# Altium footprint library USLI_Schematics.PcbLib: 92 footprints (part 4 of 6)
Each footprint in its own frame and in the unit in brackets; x right, y up, seen from the top. Pads: shape width x height; smd on the part's side, far side on the other; paste and mask are expansions set on the pad; w line width, h text height; cw(c..) or ccw(c..) is an arc to the next point about the centre after c.
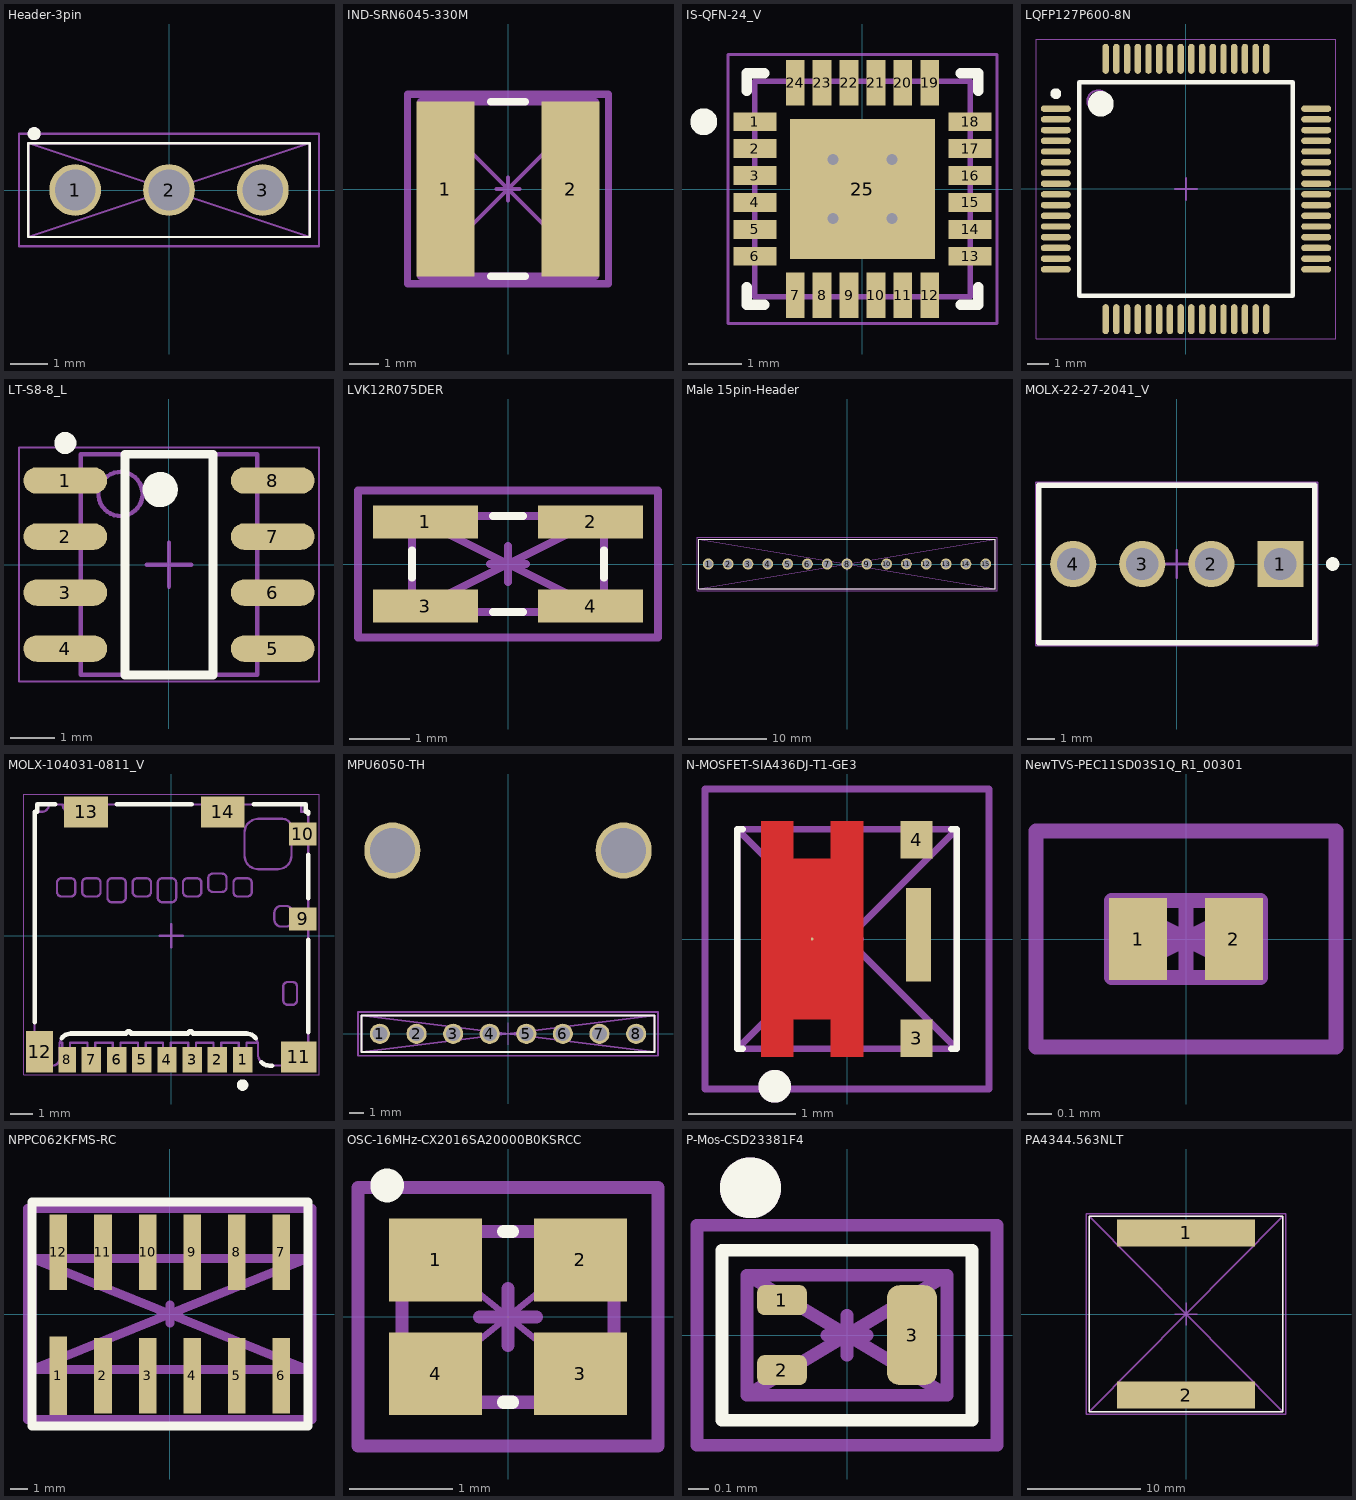
[diagram p3: the footprints below, top view; thin cyan lines are the x and y axes]

## Header-3pin [mm]
pads (3):
  round 1.4 hole 1.1 mask+0.05: 1(-2.54,0) 2(0,0) 3(2.54,0)
Top Overlay:
  circle w0.254: c-3.65,1.525 r0.05
  lines w0.064: -3.81,-1.27 -3.81,1.27 3.81,1.27 3.81,-1.27 -3.81,-1.27
Mechanical 1:
  lines w0.064: -3.81,-1.27 3.81,1.27 ; -3.81,-1.27 3.81,-1.27 ; -3.81,-1.27 -3.81,1.27 ; -3.81,1.27 3.81,-1.27 ; -3.81,1.27 3.81,1.27 ; 3.81,-1.27 3.81,1.27
  lines w0.254: -3.608,1.553 ccw(c-3.65,1.525) -3.601,1.533
Top Courtyard:
  lines w0.064: -4.06,-1.52 -3.825,-1.52 3.825,-1.52 4.06,-1.52 4.06,1.52 3.85,1.52 -3.825,1.52 -4.06,1.52 -4.06,-1.52
Top Component Center:
  lines w0.064: -0.225,0 0.225,0 ; 0,-0.175 0,0.175
3D body "61300311121.stp": height 8.55, standoff -2.99, extent -3.81,-1.27 3.81,1.27

## IND-SRN6045-330M [mm]
pads (2):
  rect 2x6 smd mask+0.05: 1(-2.15,0) 2(2.15,0)
Top Overlay:
  lines w0.256: -0.6,-3 0.6,-3 ; -0.6,3 0.6,3
Mechanical 1:
  lines w0.128: -3,-3 3,3 ; -3,3 3,-3
  lines w0.256: -3,-3 3,-3 3,3 -3,3 -3,-3
Top Courtyard:
  lines w0.256: -3.45,-3.25 3.45,-3.25 3.45,3.25 -3.45,3.25 -3.45,-3.25
Top Component Center:
  lines w0.128: -0.4,0 0.4,0 ; 0,-0.4 0,0.4
3D body "srn6045-330m.stp": height 4.5, standoff 0, extent -3,-3 3,3

## IS-QFN-24_V [mm] "QFN, 24-Leads, Body 4x4mm, Pitch 0.5mm, Thermal Pad 2.7x2.6mm"
height 0.95
pads (25):
  rect 0.8x0.35 smd mask+0.05: 1(-2,1.25) 2(-2,0.75) 3(-2,0.25) 4(-2,-0.25) 5(-2,-0.75) 6(-2,-1.25) 13(2,-1.25) 14(2,-0.75) 15(2,-0.25) 16(2,0.25) 17(2,0.75) 18(2,1.25)
  rect 0.35x0.85 smd mask+0.05: 7(-1.25,-1.975) 8(-0.75,-1.975) 9(-0.25,-1.975) 10(0.25,-1.975) 11(0.75,-1.975) 12(1.25,-1.975) 19(1.25,1.975) 20(0.75,1.975) 21(0.25,1.975) 22(-0.25,1.975) 23(-0.75,1.975) 24(-1.25,1.975)
  rect 2.7x2.6 smd mask+0.05: 25(0,0)
via -0.55,-0.55 diameter 0.5 hole 0.2
via 0.55,-0.55 diameter 0.5 hole 0.2
via 0.55,0.55 diameter 0.5 hole 0.2
via -0.55,0.55 diameter 0.5 hole 0.2
Top Overlay:
  circle w0.25: c-2.95,1.25 r0.125
  lines w0.2: -2.15,-1.825 -2.15,-2.15 -1.825,-2.15 ; -2.15,1.825 -2.15,2.15 -1.825,2.15 ; 1.825,-2.15 2.15,-2.15 2.15,-1.825 ; 1.825,2.15 2.15,2.15 2.15,1.825
Mechanical 13:
  lines w0.1: -2,-2 -2,2 2,2 2,-2 -2,-2
Mechanical 15:
  lines w0.05: -2.5,-2.5 2.5,-2.5 2.5,2.5 -2.5,2.5 -2.5,-2.5
  lines w0.1: -0.5,0 0.5,0 ; 0,-0.5 0,0.5
3D body: height 0.95, standoff 0, extent -1.999,-1.999 1.999,1.999

## LQFP127P600-8N [mm] "ARM® Cortex®-M3 STM32F1 Microcontroller IC 32-Bit Single-Core 72MHz 128KB (128K x 8) FLASH"
height 1.6
pads (64):
  oval 1.4x0.3 smd mask+0.05: 1(-6.075,3.75) 2(-6.075,3.25) 3(-6.075,2.75) 4(-6.075,2.25) 5(-6.075,1.75) 6(-6.075,1.25) 7(-6.075,0.75) 8(-6.075,0.25) 9(-6.075,-0.25) 10(-6.075,-0.75) 11(-6.075,-1.25) 12(-6.075,-1.75) 13(-6.075,-2.25) 14(-6.075,-2.75) 15(-6.075,-3.25) 16(-6.075,-3.75) 33(6.075,-3.75) 34(6.075,-3.25) 35(6.075,-2.75) 36(6.075,-2.25) 37(6.075,-1.75) 38(6.075,-1.25) 39(6.075,-0.75) 40(6.075,-0.25) 41(6.075,0.25) 42(6.075,0.75) 43(6.075,1.25) 44(6.075,1.75) 45(6.075,2.25) 46(6.075,2.75) 47(6.075,3.25) 48(6.075,3.75)
  oval 0.3x1.4 smd mask+0.05: 17(-3.75,-6.075) 18(-3.25,-6.075) 19(-2.75,-6.075) 20(-2.25,-6.075) 21(-1.75,-6.075) 22(-1.25,-6.075) 23(-0.75,-6.075) 24(-0.25,-6.075) 25(0.25,-6.075) 26(0.75,-6.075) 27(1.25,-6.075) 28(1.75,-6.075) 29(2.25,-6.075) 30(2.75,-6.075) 31(3.25,-6.075) 32(3.75,-6.075) 49(3.75,6.075) 50(3.25,6.075) 51(2.75,6.075) 52(2.25,6.075) 53(1.75,6.075) 54(1.25,6.075) 55(0.75,6.075) 56(0.25,6.075) 57(-0.25,6.075) 58(-0.75,6.075) 59(-1.25,6.075) 60(-1.75,6.075) 61(-2.25,6.075) 62(-2.75,6.075) 63(-3.25,6.075) 64(-3.75,6.075)
Top Overlay:
  circle w0.6: c-3.975,3.975 r0.3
  circle w0.25: c-6.075,4.45 r0.125
  lines w0.2: -4.975,-4.975 4.975,-4.975 4.975,4.975 -4.975,4.975 -4.975,-4.975
Top Courtyard:
  lines w0.05: -7,-7 7,-7 7,7 -7,7 -7,-7
  lines w0.1: -0.5,0 0.5,0 ; 0,-0.5 0,0.5
Top Assembly:
  circle w0.1: c-4.1,4.1 r0.5
  lines w0.1: -5,-5 5,-5 5,5 -5,5 -5,-5
3D body "STM32F103RBT6.step": height 1.53, standoff -0.07, extent -6,-6 6,6

## LT-S8-8_L [mm] "SOIC, 8-Leads, Body 5x4mm, Pitch 1.27mm, IPC High Density"
height 1.76
pads (8):
  oval 1.9x0.6 smd: 1(-2.35,1.905) 2(-2.35,0.635) 3(-2.35,-0.635) 4(-2.35,-1.905) 5(2.35,-1.905) 6(2.35,-0.635) 7(2.35,0.635) 8(2.35,1.905)
Top Overlay:
  circle w0.25: c-2.35,2.755 r0.125
  circle w0.4: c-0.2,1.7 r0.2
  lines w0.2: -1,-2.5 -1,2.5 1,2.5 1,-2.5 -1,-2.5
Mechanical 13:
  circle w0.1: c-1.1,1.6 r0.5
  lines w0.1: -2,-2.5 -2,2.5 2,2.5 2,-2.5 -2,-2.5
Mechanical 15:
  lines w0.05: -3.4,-2.65 -3.4,2.65 3.4,2.65 3.4,-2.65 -3.4,-2.65
  lines w0.1: -0.5,0 0.5,0 ; 0,-0.5 0,0.5
3D body: height 1.76, standoff 0.1, extent -2,-2.5 2,2.5

## LVK12R075DER [mm]
pads (4):
  rect 1.75x0.55 smd mask+0.05: 1(-1.375,0.7) 2(1.375,0.7) 3(-1.375,-0.7) 4(1.375,-0.7)
Top Overlay:
  lines w0.127: -1.6,-0.23 -1.6,0.23 ; -0.25,-0.8 0.25,-0.8 ; -0.25,0.8 0.25,0.8 ; 1.6,-0.23 1.6,0.23
Mechanical 1:
  lines w0.127: -1.6,-0.8 1.6,-0.8 ; -1.6,-0.8 -1.6,0.8 ; -1.6,-0.8 1.6,0.8 ; -1.6,0.8 1.6,0.8 ; -1.6,0.8 1.6,-0.8 ; 1.6,-0.8 1.6,0.8
Top Courtyard:
  lines w0.127: -2.5,-1.225 -2.5,1.225 2.5,1.225 2.5,-1.225 -2.5,-1.225
Top Component Center:
  lines w0.127: -0.3,0 0.3,0 ; 0,-0.3 0,0.3
3D body "LVK12R075DER.stp": height 0.75, standoff 0, extent -2.14,-1.14 2.14,1.14

## Male 15pin-Header [mm]
pads (15):
  round 1.4 hole 1.02 mask+0.05: 1(-17.78,0) 2(-15.24,0) 3(-12.7,0) 4(-10.16,0) 5(-7.62,0) 6(-5.08,0) 7(-2.54,0) 8(0,0) 9(2.54,0) 10(5.08,0) 11(7.62,0) 12(10.16,0) 13(12.7,0) 14(15.24,0) 15(17.78,0)
Top Overlay:
  lines w0.064: -18.975,-3.175 -18.975,3.175 18.975,3.175 18.975,-3.175 -18.975,-3.175
Mechanical 1:
  lines w0.064: -18.975,-3.175 18.975,3.175 ; -18.975,-3.175 -18.975,3.175 ; -18.975,-3.175 18.975,-3.175 ; -18.975,3.175 18.975,-3.175 ; -18.975,3.175 18.975,3.175 ; 18.975,-3.175 18.975,3.175
Top Courtyard:
  lines w0.064: -19.225,-3.425 -19.225,3.425 19.225,3.425 19.225,-3.425 -19.225,-3.425
Top Component Center:
  lines w0.064: -0.775,0 0,0 0.775,0 ; 0,-0.775 0,0.775
3D body "022232151.stp": height 10.58, standoff -3.64, extent -18.974,-3.251 18.974,3.099

## MOLX-22-27-2041_V [mm] "CONN, 4-Leads, Body 10.16x5.8mm, Pitch 2.54mm"
height 11.7
pads (4):
  rect 1.7x1.7 hole 1.19: 1(3.81,0)
  round 1.7 hole 1.19: 2(1.27,0) 3(-1.27,0) 4(-3.81,0)
Top Overlay:
  circle w0.25: c5.73,0 r0.125
  lines w0.2: -5.08,-2.9 5.08,-2.9 5.08,2.9 -5.08,2.9 -5.08,-2.9
Mechanical 13:
  lines w0.1: -5.08,-2.9 5.08,-2.9 5.08,2.9 -5.08,2.9 -5.08,-2.9
Mechanical 15:
  lines w0.05: -5.18,-3 -5.18,3 5.18,3 5.18,-3 -5.18,-3
  lines w0.1: -0.5,0 0.5,0 ; 0,-0.5 0,0.5
3D body "022272041.stp": height 11.7, standoff -3.56, extent -5.08,-2.9 5.08,2.9

## MOLX-104031-0811_V [mm] "Micro SD, 8-Leads, Body 11.95x11.4mm, Pitch 1.1mm"
height 1.57
pads (14):
  rect 0.85x1.1 smd: 1(3.113,-5.412) 2(2.013,-5.412) 3(0.913,-5.412) 4(-0.188,-5.412) 5(-1.288,-5.412) 6(-2.387,-5.412) 7(-3.487,-5.412)
  rect 0.75x1.1 smd: 8(-4.537,-5.412)
  rect 1.2x1 smd: 9(5.748,0.738) 10(5.748,4.438)
  rect 1.55x1.35 smd: 11(5.573,-5.287)
  rect 1.17x1.8 smd: 12(-5.747,-5.062)
  rect 1.9x1.35 smd: 13(-3.722,5.413) 14(2.248,5.413)
Top Overlay:
  circle w0.25: c3.113,-6.512 r0.125
  lines w0.2: -5.968,-3.762 -5.968,5.418 -5.848,5.418 -5.848,5.738 -5.343,5.738 -5.072,5.738 ; -4.777,-4.462 cw(c-4.378,-4.762) -4.378,-4.262 -1.962,-4.262 cw(c-1.862,-4.262) -1.862,-4.162 cw(c-1.862,-4.262) -1.762,-4.262 0.738,-4.262 cw(c0.838,-4.262) 0.838,-4.162 cw(c0.838,-4.262) 0.938,-4.262 3.283,-4.262 cw(c3.283,-4.762) 3.692,-4.476 ; -2.372,5.738 0.898,5.738 ; 3.598,5.738 5.678,5.738 5.863,5.738 5.863,5.418 5.983,5.418 5.983,5.338 ; 3.938,-5.525 ccw(c4.283,-5.162) 4.283,-5.662 4.397,-5.662 ; 5.977,-4.212 5.977,-0.162 ; 5.983,1.638 5.983,3.538
Mechanical 13:
  drawing of 227 lines, arcs and shapes, not listed
Mechanical 15:
  lines w0.05: -6.432,-6.062 -6.432,6.188 6.448,6.188 6.448,-6.062 -6.432,-6.062
  lines w0.1: -0.5,0 0.5,0 ; 0,-0.5 0,0.5
3D body "1040310811.stp": height 1.45, standoff 0, extent -5.967,-5.662 5.983,5.738

## MPU6050-TH [mm] "HDR100IMP08F-G-V-ST"
pads (10):
  round 1.4 hole 1.02 mask+0.05: 1(-8.89,0) 2(-6.35,0) 3(-3.81,0) 4(-1.27,0) 5(1.27,0) 6(3.81,0) 7(6.35,0) 8(8.89,0)
  round 3.9 hole 3.12 mask+0.05: ""(-8.025,12.725) ""(8.025,12.725)
Top Overlay:
  lines w0.127: -10.16,-1.27 10.16,-1.27 10.16,1.27 -10.16,1.27 -10.16,-1.27
Mechanical 1:
  lines w0.127: -10.16,-1.27 10.16,1.27 ; -10.16,-1.27 10.16,-1.27 ; -10.16,-1.27 -10.16,1.27 ; -10.16,1.27 10.16,-1.27 ; -10.16,1.27 10.16,1.27 ; 10.16,-1.27 10.16,1.27
Top Courtyard:
  lines w0.127: -10.41,-1.52 -10.41,1.52 10.41,1.52 10.41,-1.52 -10.41,-1.52
Top Component Center:
  lines w0.064: -0.775,0 0,0 0.775,0 ; 0,-0.775 0,0.775
3D body "CHC M3 L12.step": height 13.3, standoff -1.7, extent 5.3,10 10.75,15.45
3D body "CHC M3 L12.step": height 13.3, standoff -1.7, extent -10.75,10 -5.3,15.45
3D body "MPU_6050.step": height 11.5, standoff 8.5, extent -10.25,-1 10.25,15
3D body "pin_header_female_2.54mm_0.1in.STEP": height 8.5, standoff -8.26, extent -10.16,-1.27 10.16,1.27

## N-MOSFET-SIA436DJ-T1-GE3 [mm]
pads (4):
  rect 0.3x0.35 smd mask+0.05: 3(0.65,-0.925) 4(0.65,0.925)
  round 0.025 smd mask+0.05: 5(-0.325,0)
  rect 0.235x0.87 smd mask+0.05: ""(0.667,0.04)
Top Layer:
  region: -0.501,-0.756 -0.5,-0.755 -0.501,-0.928 -0.502,-1.099 -0.799,-1.099 -0.8,-1.099 -0.8,1.1 -0.5,1.1 -0.5,0.75 -0.15,0.75 -0.15,1.1 0.15,1.1 0.15,-1.1 -0.149,-1.1 -0.15,-1.1 -0.15,-0.926 -0.15,-0.751 -0.452,-0.751 -0.5,-0.751 -0.5,-0.756
Top Overlay:
  circle w0.254: c-0.675,-1.375 r0.025
  lines w0.064: -0.975,-1.025 -1.025,-1.025 -1.025,1.025 -0.975,1.025 ; 0.975,-1.025 1.025,-1.025 1.025,1.025 0.975,1.025
Mechanical 1:
  circle w0.254: c-0.675,-1.375 r0.025
  lines w0.064: -1.025,-1.025 -1.025,1.025 ; -1.025,-1.025 1.025,-1.025 ; -1.025,-1.025 1.025,1.025 ; -1.025,1.025 1.025,1.025 ; -1.025,1.025 1.025,-1.025 ; 1.025,-1.025 1.025,1.025
Top Courtyard:
  lines w0.064: -1.325,-1.4 -1.325,1.4 -1.075,1.4 1.05,1.4 1.325,1.4 1.325,-1.4 1.05,-1.4 -1.025,-1.4 -1.325,-1.4
Top Component Center:
  lines w0.064: -0.125,0 0,0 0.125,0 ; 0,-0.125 0,0.125
3D body "SIA436DJ-T1-GE3.STEP": height 0.8, standoff 0, extent -1.025,-1.025 1.025,1.025

## NewTVS-PEC11SD03S1Q_R1_00301 [mm]
pads (2):
  rect 0.24x0.34 smd mask+0.05: 1(-0.2,0) 2(0.2,0)
Mechanical 1:
  lines w0.064: -0.31,-0.16 0.31,0.16 ; -0.31,-0.16 -0.31,0.16 ; -0.31,-0.16 -0.31,0.16 ; -0.31,-0.16 0.31,-0.16 ; -0.31,0.16 0.31,-0.16 ; -0.31,0.16 0.31,0.16 ; 0.31,-0.16 0.31,0.16
Top Courtyard:
  lines w0.064: -0.625,-0.45 -0.625,0.45 0.625,0.45 0.625,-0.45 -0.625,-0.45
Top Component Center:
  lines w0.064: -0.15,0 0,0 0.15,0 ; 0,-0.15 0,0.15
3D body "0201_RES.stp": height 0.2, standoff -0.02, extent -0.3,-0.15 0.3,0.15

## NPPC062KFMS-RC [mm]
pads (12):
  rect 1x4.5 smd mask+0.05: 1(-6.35,-3.52)
  rect 1x4.32 smd mask+0.05: 2(-3.81,-3.52) 3(-1.27,-3.52) 4(1.27,-3.52) 5(3.81,-3.52) 6(6.35,-3.52) 7(6.35,3.52) 8(3.81,3.52) 9(1.27,3.52) 10(-1.27,3.52) 11(-3.81,3.52) 12(-6.35,3.52)
Top Overlay:
  lines w0.512: -7.87,-6.4 -7.87,6.4 7.87,6.4 7.87,-6.4 -7.87,-6.4
Mechanical 1:
  lines w0.512: -7.87,-3.175 -7.87,3.175 ; -7.87,-3.175 7.87,-3.175 ; -7.87,-3.175 7.87,3.175 ; -7.87,3.175 7.87,3.175 ; -7.87,3.175 7.87,-3.175 ; 7.87,-3.175 7.87,3.175
Top Courtyard:
  lines w0.512: -8.12,-6.025 8.12,-6.025 8.12,6.025 -8.12,6.025 -8.12,-6.025
Top Component Center:
  lines w0.512: -0.5,0 0,0 0.5,0 ; 0,-0.5 0,0.5
3D body "NPPC062KFMS-RC.STEP": height 7.59, standoff 0.1, extent -7.874,-3.429 7.874,3.429

## OSC-16MHz-CX2016SA20000B0KSRCC [mm]
pads (4):
  rect 0.9x0.8 smd mask+0.05: 1(-0.7,0.55) 2(0.7,0.55) 3(0.7,-0.55) 4(-0.7,-0.55)
Top Overlay:
  circle w0.254: c-1.168,1.27 r0.035
  lines w0.127: -0.045,-0.825 0.045,-0.825 ; -0.045,0.825 0.045,0.825
Mechanical 1:
  circle w0.254: c-1.168,1.27 r0.025
  lines w0.064: -1.025,-0.825 1.025,0.825 ; -1.025,0.825 1.025,-0.825
  lines w0.127: -1.025,-0.825 1.025,-0.825 1.025,0.825 -1.025,0.825 -1.025,-0.825
Top Courtyard:
  lines w0.127: -1.175,-1.25 -1.45,-1.25 -1.45,1.25 -1.125,1.25 1.175,1.25 1.45,1.25 ; -1.175,-1.25 1.175,-1.25 ; -1.175,-1.25 1.175,-1.25 ; 1.175,-1.25 1.45,-1.25 ; 1.45,-1.25 1.45,1.25 ; 1.45,-1.25 1.45,1.25
Top Component Center:
  lines w0.127: -0.275,0 0.275,0 ; 0,-0.275 0,0.275

## P-Mos-CSD23381F4 [mm]
pads (3):
  rrect50% 0.25x0.15 smd mask+0.05: 1(-0.325,0.175) 2(-0.325,-0.175)
  rrect50% 0.25x0.5 smd mask+0.05: 3(0.325,0)
Top Overlay:
  circle w0.254: c-0.483,0.737 r0.025
  lines w0.064: -0.625,-0.425 -0.625,0.425 0.625,0.425 0.625,-0.425 -0.625,-0.425
Mechanical 1:
  circle w0.254: c-0.483,0.737 r0.025
  lines w0.064: -0.5,-0.3 0.5,-0.3 ; -0.5,-0.3 -0.5,0.3 ; -0.5,-0.3 -0.5,0.3 ; -0.5,-0.3 0.5,0.3 ; -0.5,0.3 0.5,0.3 ; -0.5,0.3 0.5,-0.3 ; 0.5,-0.3 0.5,0.3
Top Courtyard:
  lines w0.064: -0.75,-0.55 0.75,-0.55 0.75,0.55 -0.75,0.55 -0.75,-0.55
Top Component Center:
  lines w0.064: -0.1,0 0,0 0.1,0 ; 0,-0.1 0,0.1
3D body "YJC0003A_TEX.step": height 0.34, standoff 0, extent -0.521,-0.318 0.521,0.318

## PA4344.563NLT [mm]
pads (2):
  rect 12.2x2.4 smd mask+0.05: 1(0,7.2) 2(0,-7.2)
Top Overlay:
  lines w0.127: -8.6,-8.65 -8.6,8.65 8.6,8.65 8.6,-8.65 -8.6,-8.65
Mechanical 1:
  lines w0.127: -8.6,-8.65 8.6,8.65 ; -8.6,-8.65 -8.6,8.65 ; -8.6,-8.65 8.6,-8.65 ; -8.6,8.65 8.6,-8.65 ; -8.6,8.65 8.6,8.65 ; 8.6,-8.65 8.6,8.65
Top Courtyard:
  lines w0.127: -8.85,-8.9 -8.85,8.9 8.85,8.9 8.85,-8.9 -8.85,-8.9
Top Component Center:
  lines w0.127: -1,0 0,0 1,0 ; 0,-1 0,1
3D body "PA4344.STEP": height 6.7, standoff 0, extent -8.45,-8.65 8.45,8.65